# Altium footprint library Sockets.PcbLib: 80 footprints (part 4 of 6) (continued)
## IDI_220393-000_a [mm] "196 Pins, Pitch 0.8mm, Matrix 14x14, BGA Test Socket (Contactor Part)"
height 6.41
pads (8):
  round 0.5 hole 1.55 unplated: 1(-14.25,14.25) 2(-14.25,-14.25) 3(14.25,-14.25) 4(14.25,14.25)
  round 0.5 hole 2.4 unplated: 5(-16.75,16.75) 6(-16.75,-16.75) 7(16.75,-16.75) 8(16.75,16.75)
Top Layer:
  circle w0.915: c-16.75,16.75 r1.793
  circle w0.915: c-16.75,-16.75 r1.793
  circle w0.915: c16.75,-16.75 r1.793
  circle w0.915: c16.75,16.75 r1.793
Bottom Layer:
  circle w0.915: c-16.75,16.75 r1.793
  circle w0.915: c-16.75,-16.75 r1.793
  circle w0.915: c16.75,-16.75 r1.793
  circle w0.915: c16.75,16.75 r1.793
Top Overlay:
  lines w0.2: -20.05,-17.75 ccw(c-17.75,-17.75) -17.75,-20.05 17.75,-20.05 ccw(c17.75,-17.75) 20.05,-17.75 20.05,17.75 ccw(c17.75,17.75) 17.75,20.05 -17.75,20.05 ccw(c-17.75,17.75) -20.05,17.75 -20.05,-17.75
  text "A1" at -22.437,17.235 h1.2
Top Solder:
  drawing of 69 lines, arcs and shapes, not listed
Mechanical 8:
  drawing of 518 lines, arcs and shapes, not listed
  text "COMPONENT" at 4.13,15.435 h1
  text "CLEARANCE HEIGHT 2mm" at 8.85,17.725 h1
  text "CLEARANCE HEIGHT 1mm" at 8.59,12.5 h1
  text "COMPONENT" at 15.435,-4.13 h1
  text "CLEARANCE HEIGHT 2mm" at 17.725,-8.85 h1
  text "CLEARANCE HEIGHT 1mm" at 12.5,-8.59 h1
  text "COMPONENT" at -4.13,-15.435 h1
  text "CLEARANCE HEIGHT 2mm" at -8.85,-17.725 h1
  text "CLEARANCE HEIGHT 1mm" at -8.59,-12.5 h1
  text "CLEARANCE HEIGHT 1mm" at -12.5,8.59 h1
  text "CLEARANCE HEIGHT 2mm" at -17.725,8.85 h1
  text "COMPONENT" at -15.435,4.13 h1
Mechanical 14:
  drawing of 216 lines, arcs and shapes, not listed
  text "A1" at -22.437,17.235 h1.2
  text "A1" at -7.75,9.596 h1.2
  text "A1" at -11.238,13.15 h1.2
Mechanical 15:
  lines w0.05: -20.3,-17.75 ccw(c-17.75,-17.75) -17.75,-20.3 17.75,-20.3 ccw(c17.75,-17.75) 20.3,-17.75 20.3,17.75 ccw(c17.75,17.75) 17.75,20.3 -17.75,20.3 ccw(c-17.75,17.75) -20.3,17.75 -20.3,-17.75
3D body "IDI_220393-000_Part2.stp": height -1.6, standoff -4.3, extent -19.25,-19.245 19.23,19.245
3D body "IDI_220393-000_Part1.stp": height 6.43, standoff -5.77, extent -19.75,-19.75 19.75,19.75

## IDI_220394-000 [mm] "Removable Clamshell for 196 Pins, Pitch 0.8mm, Matrix 14x14, BGA Test Socket"
height 36.5
Top Overlay:
  lines w0.2: -50.3,-1.624 -49.624,-2.3 -20.05,-2.3 -20.05,-16.97 ccw(c-17.75,-16.97) -19.376,-18.596 -16.546,-21.426 ccw(c-14.92,-19.8) -14.92,-22.1 -8.38,-22.1 -8.38,-22.6 8.37,-22.6 8.37,-22.1 14.92,-22.1 ccw(c14.92,-19.8) 16.546,-21.427 19.376,-18.598 ccw(c17.75,-16.972) 20.05,-16.972 20.05,16.172 ccw(c17.75,16.172) 19.376,17.798 16.548,20.626 ccw(c14.922,19) 14.922,21.3 -14.922,21.3 ccw(c-14.922,19) -16.548,20.626 -19.377,17.796 ccw(c-17.75,16.17) -20.05,16.17 -20.05,2.3 -49.624,2.3 -50.3,1.624 -50.3,-1.624
Mechanical 8:
  lines w0.1: -0.5,0 0,0 ; 0,-0.5 0,0 ; 0,0.5 0,0 ; 0.5,0 0,0
Mechanical 14:
  circle w0.1: c0,0 r4.5
  circle w0.1: c0,0 r2.5
  circle w0.1: c-15,0 r1.025
  circle w0.1: c-7.95,7.95 r1.9
  circle w0.1: c-7.95,-7.95 r1.9
  circle w0.1: c7.95,-7.95 r1.9
  circle w0.1: c7.95,7.95 r1.9
  circle w0.1: c-15,0 r1.25
  circle w0.1: c12,12 r0.8
  circle w0.1: c0,16.97 r0.8
  circle w0.1: c-12,12 r0.8
  circle w0.1: c-12,-12 r0.8
  circle w0.1: c0,-16.97 r0.8
  circle w0.1: c12,-12 r0.8
  circle w0.1: c16.97,0 r0.8
  circle w0.1: c0,0 r19.5
  circle w0.1: c0,0 r9
  lines w0.1: -19.42,-1.8 ccw(c-18.427,-1.704) -19.17,-2.37 cw(c-23.555,-6.31) -17.79,-7.54 ccw(c-16.821,-7.723) -17.71,-8.15 ; -19.42,1.8 cw(c-18.427,1.704) -19.17,2.37 ccw(c-23.555,6.31) -17.79,7.54 cw(c-16.821,7.723) -17.71,8.15 ; -19.38,-2 -49.5,-2 ; -19.38,2 -49.5,2 ; -19.16,-18.39 -16.34,-21.21 ; -19.16,17.59 -16.34,20.41 ; -18.5,-6.16 -18.5,-12.67 ccw(c-16.5,-12.67) -17.914,-14.084 ; -18.5,6.16 -18.5,12.67 cw(c-16.5,12.67) -17.914,14.084 ; -17.91,-14.09 -15.09,-16.91 ; -17.91,14.09 -15.09,16.91 ; -16.334,20.414 cw(c-14.92,19) -14.92,21 14.92,21 cw(c14.92,19) 16.334,20.414 ; -15.92,-11.26 ccw(c-15.107,-10.684) -15.42,-11.63 cw(c-17.246,-17.246) -11.63,-15.42 ccw(c-10.684,-15.107) -11.26,-15.92 ; -15.92,11.26 cw(c-15.107,10.684) -15.42,11.63 ccw(c-17.246,17.246) -11.63,15.42 cw(c-10.684,15.107) -11.26,15.92 ; -15.084,-16.914 ccw(c-13.67,-15.5) -13.67,-17.5 -8.6,-17.5 ; -15.084,16.914 cw(c-13.67,15.5) -13.67,17.5 -8.6,17.5 ; -10.031,-7.398 cw(c0,0) -10.031,7.398 ; -9.48,-6.43 -7.7,-4.66 ; -9.48,6.43 -7.7,4.66 ; -9.47,-6.43 ccw(c-7.95,-7.95) -6.43,-9.47 ; -9.47,6.43 cw(c-7.95,7.95) -6.43,9.47 ; -8.855,-1.631 cw(c-7.04,0) -8.855,1.631 ; -8.15,-17.71 ccw(c-7.723,-16.821) -7.54,-17.79 cw(c-6.31,-23.555) -2.37,-19.17 ccw(c-1.704,-18.427) -1.8,-19.42 ; -8.15,17.71 cw(c-7.723,16.821) -7.54,17.79 ccw(c-6.31,23.555) -2.37,19.17 cw(c-1.704,18.427) -1.8,19.42 ; -8.08,-17.75 -8.08,-21.8 ; -8,-19.8 8,-19.8 ; -8,-19.1 -3.93,-19.1 ; -8,-17.78 -8,-22.3 8,-22.3 8,-17.78 ; -7.398,-10.031 ccw(c0,0) 7.398,-10.031 ; -7.398,10.031 cw(c0,0) 7.398,10.031 ; -6.43,-9.48 -4.66,-7.7 ; -6.43,9.48 -4.66,7.7 ; -3,-19.8 -3,-19.27 ; 1.8,-19.42 ccw(c1.704,-18.427) 2.37,-19.17 cw(c6.31,-23.555) 7.54,-17.79 ccw(c7.723,-16.821) 8.15,-17.71 ; 1.8,19.42 cw(c1.704,18.427) 2.37,19.17 ccw(c6.31,23.555) 7.54,17.79 cw(c7.723,16.821) 8.15,17.71 ; 3,-19.8 3,-19.27 ; 3.93,-19.1 8,-19.1 ; 4.66,-7.7 6.43,-9.48 ; 4.66,7.7 6.43,9.48 ; 6.43,-9.47 ccw(c7.95,-7.95) 9.47,-6.43 ; 6.43,9.47 cw(c7.95,7.95) 9.47,6.43 ; 7.7,-4.66 9.48,-6.43 ; 7.7,4.66 9.48,6.43 ; 8.07,-17.75 8.07,-21.8 ; 8.6,-17.5 13.67,-17.5 ccw(c13.67,-15.5) 15.084,-16.914 ; 8.6,17.5 13.67,17.5 cw(c13.67,15.5) 15.084,16.914 ; 10.031,-7.398 ccw(c0,0) 10.031,7.398 ; 11.26,-15.92 ccw(c10.684,-15.107) 11.63,-15.42 cw(c17.245,-17.246) 15.42,-11.63 ccw(c15.107,-10.684) 15.92,-11.26 ; 11.26,15.92 cw(c10.684,15.107) 11.63,15.42 ccw(c17.245,17.246) 15.42,11.63 cw(c15.107,10.684) 15.92,11.26 ; 15.09,-16.91 17.91,-14.09 ; 15.09,16.91 17.91,14.09 ; 16.334,-21.214 cw(c14.92,-19.8) 14.92,-21.8 ; 16.34,-21.21 19.16,-18.39 ; 16.34,20.41 19.16,17.59 ; 17.71,-8.15 ccw(c16.821,-7.723) 17.79,-7.54 cw(c23.555,-6.31) 19.17,-2.37 ccw(c18.427,-1.704) 19.42,-1.8 ; 17.71,8.15 cw(c16.821,7.723) 17.79,7.54 ccw(c23.555,6.31) 19.17,2.37 cw(c18.427,1.704) 19.42,1.8 ; 17.914,-14.084 ccw(c16.5,-12.67) 18.5,-12.67 18.5,-6.16 ; 17.914,14.084 cw(c16.5,12.67) 18.5,12.67 18.5,6.16 ; 19.164,-18.384 ccw(c17.75,-16.97) 19.75,-16.97 19.75,16.17 ccw(c17.75,16.17) 19.164,17.584 ; -50,-1.5 -50,1.5 ; -50,-1.5 -49.5,-2 ; -50,-1.5 -49.5,-2 ; -50,-1.5 -50,1.5 ; -50,1.5 -49.5,2 ; -50,1.5 -49.5,2 ; -49.5,-2 -49.5,2 ; -49.5,-2 -19.75,-2 ; -49.5,2 -19.75,2 ; -19.75,-16.97 ccw(c-17.75,-16.97) -19.164,-18.384 ; -19.75,-16.97 ccw(c-17.75,-16.97) -19.164,-18.384 ; -19.75,-16.97 -19.75,-2 ; -19.75,-16.97 -19.75,-2 ; -19.75,2 -19.75,16.17 ; -19.75,2 -19.75,16.17 ; -19.75,16.17 cw(c-17.75,16.17) -19.164,17.584 ; -19.75,16.17 cw(c-17.75,16.17) -19.165,17.584 ; -19.164,-18.384 -16.334,-21.214 ; -19.165,17.584 -16.336,20.414 cw(c-14.922,19) -14.922,21 14.922,21 cw(c14.922,19) 16.336,20.414 19.164,17.586 cw(c17.75,16.172) 19.75,16.172 19.75,-16.972 cw(c17.75,-16.972) 19.164,-18.386 16.334,-21.215 cw(c14.92,-19.8) 14.92,-21.8 ; -16.334,-21.214 ccw(c-14.92,-19.8) -14.92,-21.8 ; -16.334,-21.214 ccw(c-14.92,-19.8) -14.92,-21.8 ; -14.92,-21.8 -8.08,-21.8 ; -14.92,-21.8 -8.08,-21.8 ; -8.08,-21.8 -8.08,-22.3 8.07,-22.3 8.07,-21.8 ; 8.07,-21.8 14.92,-21.8 ; 8.07,-21.8 14.92,-21.8
Mechanical 15:
  lines w0.05: -50.55,-1.728 -49.728,-2.55 -20.3,-2.55 -20.3,-16.97 ccw(c-17.75,-16.97) -19.553,-18.773 -16.723,-21.603 ccw(c-14.92,-19.8) -14.92,-22.35 -8.63,-22.35 -8.63,-22.85 8.62,-22.85 8.62,-22.35 14.92,-22.35 ccw(c14.92,-19.8) 16.723,-21.604 19.553,-18.775 ccw(c17.75,-16.972) 20.3,-16.972 20.3,16.172 ccw(c17.75,16.172) 19.553,17.975 16.725,20.803 ccw(c14.922,19) 14.922,21.55 -14.922,21.55 ccw(c-14.922,19) -16.725,20.803 -19.554,17.973 ccw(c-17.75,16.17) -20.3,16.17 -20.3,2.55 -49.728,2.55 -50.55,1.728 -50.55,-1.728
3D body "IDI_220394-000.stp": height 44.75, standoff 4.45, extent -50,-22.3 19.75,21

## MIL-MAX_917-93-103-41-005000 [mm] "3 Leads Through-Hole TO-5 Socket"
height 4.2
pads (3):
  round 1.5 hole 0.8: 1(0,2.54) 2(-2.54,0) 3(0,-2.54)
Top Overlay:
  lines w0.2: 2.533,4.315 ccw(c0,0) 4.315,2.533 ccw(c3.538,3.538) 2.533,4.315
Mechanical 8:
  lines w0.1: -3.04,0 -2.54,0 ; -2.54,-0.5 -2.54,0 ; -2.54,0.5 -2.54,0 ; -2.04,0 -2.54,0 ; -0.5,-2.54 0,-2.54 ; -0.5,0 0,0 ; -0.5,2.54 0,2.54 ; 0,-3.04 0,-2.54 ; 0,-2.04 0,-2.54 ; 0,-0.5 0,0 ; 0,0.5 0,0 ; 0,2.04 0,2.54 ; 0,3.04 0,2.54 ; 0.5,-2.54 0,-2.54 ; 0.5,0 0,0 ; 0.5,2.54 0,2.54
Mechanical 14:
  circle w0.1: c0,2.54 r0.546
  circle w0.1: c-2.54,0 r0.546
  circle w0.1: c0,-2.54 r0.546
  lines w0.1: 2.533,4.315 ccw(c0,0) 4.315,2.533 ccw(c3.538,3.538) 2.533,4.315
3D body "MIL-MAX_917-93-103-41-005000.stp": height 4.19, standoff -3.18, extent -4.982,-4.982 5.002,5.002

## MIL-MAX_917-93-103-41-005000_a [mm] "3 Leads Through-Hole TO-5 Socket"
height 4.2
Top Overlay:
  lines w0.2: 2.533,4.315 ccw(c0,0) 4.315,2.533 ccw(c3.538,3.538) 2.533,4.315
Mechanical 8:
  lines w0.1: -3.04,0 -2.54,0 ; -2.54,-0.5 -2.54,0 ; -2.54,0.5 -2.54,0 ; -2.04,0 -2.54,0 ; -0.5,-2.54 0,-2.54 ; -0.5,0 0,0 ; -0.5,2.54 0,2.54 ; 0,-3.04 0,-2.54 ; 0,-2.04 0,-2.54 ; 0,-0.5 0,0 ; 0,0.5 0,0 ; 0,2.04 0,2.54 ; 0,3.04 0,2.54 ; 0.5,-2.54 0,-2.54 ; 0.5,0 0,0 ; 0.5,2.54 0,2.54
Mechanical 14:
  circle w0.1: c0,2.54 r0.546
  circle w0.1: c-2.54,0 r0.546
  circle w0.1: c0,-2.54 r0.546
  lines w0.1: 2.533,4.315 ccw(c0,0) 4.315,2.533 ccw(c3.538,3.538) 2.533,4.315
3D body "MIL-MAX_917-93-103-41-005000.stp": height 4.19, standoff -3.18, extent -4.982,-4.982 5.002,5.002

## MIL-MAX_917-93-104-41-005000 [mm] "4 Leads Through-Hole TO-5 Socket"
height 4.2
pads (4):
  round 1.5 hole 0.8: 1(0,2.54) 2(-2.54,0) 3(0,-2.54) 4(2.54,0)
Top Overlay:
  lines w0.2: 2.533,4.315 cw(c3.538,3.538) 4.315,2.533 cw(c0,0) 2.533,4.315
Mechanical 8:
  lines w0.1: -3.04,0 -2.54,0 ; -2.54,-0.5 -2.54,0 ; -2.54,0.5 -2.54,0 ; -2.04,0 -2.54,0 ; -0.5,-2.54 0,-2.54 ; -0.5,0 0,0 ; -0.5,2.54 0,2.54 ; 0,-3.04 0,-2.54 ; 0,-2.04 0,-2.54 ; 0,-0.5 0,0 ; 0,0.5 0,0 ; 0,2.04 0,2.54 ; 0,3.04 0,2.54 ; 0.5,-2.54 0,-2.54 ; 0.5,0 0,0 ; 0.5,2.54 0,2.54 ; 2.04,0 2.54,0 ; 2.54,-0.5 2.54,0 ; 2.54,0.5 2.54,0 ; 3.04,0 2.54,0
Mechanical 14:
  circle w0.1: c2.54,0 r0.546
  circle w0.1: c0,-2.54 r0.546
  circle w0.1: c-2.54,0 r0.546
  circle w0.1: c0,2.54 r0.546
  lines w0.1: 2.533,4.315 cw(c3.538,3.538) 4.315,2.533 cw(c0,0) 2.533,4.315
3D body "MIL-MAX_917-93-104-41-005000.stp": height 4.19, standoff -3.18, extent -4.982,-4.982 5.002,5.002

## MIL-MAX_917-93-104-41-005000_a [mm] "4 Leads Through-Hole TO-5 Socket"
height 4.2
Top Overlay:
  lines w0.2: 2.533,4.315 ccw(c0,0) 4.315,2.533 ccw(c3.538,3.538) 2.533,4.315
Mechanical 8:
  lines w0.1: -3.04,0 -2.54,0 ; -2.54,-0.5 -2.54,0 ; -2.54,0.5 -2.54,0 ; -2.04,0 -2.54,0 ; -0.5,-2.54 0,-2.54 ; -0.5,0 0,0 ; -0.5,2.54 0,2.54 ; 0,-3.04 0,-2.54 ; 0,-2.04 0,-2.54 ; 0,-0.5 0,0 ; 0,0.5 0,0 ; 0,2.04 0,2.54 ; 0,3.04 0,2.54 ; 0.5,-2.54 0,-2.54 ; 0.5,0 0,0 ; 0.5,2.54 0,2.54 ; 2.04,0 2.54,0 ; 2.54,-0.5 2.54,0 ; 2.54,0.5 2.54,0 ; 3.04,0 2.54,0
Mechanical 14:
  circle w0.1: c0,2.54 r0.546
  circle w0.1: c-2.54,0 r0.546
  circle w0.1: c0,-2.54 r0.546
  circle w0.1: c2.54,0 r0.546
  lines w0.1: 2.533,4.315 ccw(c0,0) 4.315,2.533 ccw(c3.538,3.538) 2.533,4.315
3D body "MIL-MAX_917-93-104-41-005000.stp": height 4.19, standoff -3.18, extent -4.982,-4.982 5.002,5.002

## MOLEX_87782-3003 [mm] "244 Positions, 0.6mm Pitch, miniDIMM DDR3 Vertical Socket"
height 17
pads (250):
  rect 0.35x1.75 smd: 1(-37.8,-1.38) 2(-37.2,-1.38) 3(-36.6,-1.38) 4(-36,-1.38) 5(-35.4,-1.38) 6(-34.8,-1.38) 7(-34.2,-1.38) 8(-33.6,-1.38) 9(-33,-1.38) 10(-32.4,-1.38) 11(-31.8,-1.38) 12(-31.2,-1.38) 13(-30.6,-1.38) 14(-30,-1.38) 15(-29.4,-1.38) 16(-28.8,-1.38) 17(-28.2,-1.38) 18(-27.6,-1.38) 19(-27,-1.38) 20(-26.4,-1.38) 21(-25.8,-1.38) 22(-25.2,-1.38) 23(-24.6,-1.38) 24(-24,-1.38) 25(-23.4,-1.38) 26(-22.8,-1.38) 27(-22.2,-1.38) 28(-21.6,-1.38) 29(-21,-1.38) 30(-20.4,-1.38) 31(-19.8,-1.38) 32(-19.2,-1.38) 33(-18.6,-1.38) 34(-18,-1.38) 35(-17.4,-1.38) 36(-16.8,-1.38) 37(-16.2,-1.38) 38(-15.6,-1.38) 39(-15,-1.38) 40(-14.4,-1.38) 41(-13.8,-1.38) 42(-13.2,-1.38) 43(-12.6,-1.38) 44(-12,-1.38) 45(-11.4,-1.38) 46(-10.8,-1.38) 47(-10.2,-1.38) 48(-9.6,-1.38) 49(-9,-1.38) 50(-8.4,-1.38) 51(-7.8,-1.38) 52(-7.2,-1.38) 53(-6.6,-1.38) 54(-6,-1.38) 55(-5.4,-1.38) 56(-4.8,-1.38) 57(-4.2,-1.38) 58(-3.6,-1.38) 59(-3,-1.38) 60(-2.4,-1.38) 61(-1.8,-1.38) 62(-1.2,-1.38) 63(-0.6,-1.38) 64(0,-1.38) 65(0.6,-1.38) 66(4.2,-1.38) 67(4.8,-1.38) 68(5.4,-1.38) 69(6,-1.38) 70(6.6,-1.38) 71(7.2,-1.38) 72(7.8,-1.38) 73(8.4,-1.38) 74(9,-1.38) 75(9.6,-1.38) 76(10.2,-1.38) 77(10.8,-1.38) 78(11.4,-1.38) 79(12,-1.38) 80(12.6,-1.38) 81(13.2,-1.38) 82(13.8,-1.38) 83(14.4,-1.38) 84(15,-1.38) 85(15.6,-1.38) 86(16.2,-1.38) 87(16.8,-1.38) 88(17.4,-1.38) 89(18,-1.38) 90(18.6,-1.38) 91(19.2,-1.38) 92(19.8,-1.38) 93(20.4,-1.38) 94(21,-1.38) 95(21.6,-1.38) 96(22.2,-1.38) 97(22.8,-1.38) 98(23.4,-1.38) 99(24,-1.38) 100(24.6,-1.38) 101(25.2,-1.38) 102(25.8,-1.38) 103(26.4,-1.38) 104(27,-1.38) 105(27.6,-1.38) 106(28.2,-1.38) 107(28.8,-1.38) 108(29.4,-1.38) 109(30,-1.38) 110(30.6,-1.38) 111(31.2,-1.38) 112(31.8,-1.38) 113(32.4,-1.38) 114(33,-1.38) 115(33.6,-1.38) 116(34.2,-1.38) 117(34.8,-1.38) 118(35.4,-1.38) 119(36,-1.38) 120(36.6,-1.38) 121(37.2,-1.38) 122(37.8,-1.38) 123(-37.8,1.38) 124(-37.2,1.38) 125(-36.6,1.38) 126(-36,1.38) 127(-35.4,1.38) 128(-34.8,1.38) 129(-34.2,1.38) 130(-33.6,1.38) 131(-33,1.38) 132(-32.4,1.38) 133(-31.8,1.38) 134(-31.2,1.38) 135(-30.6,1.38) 136(-30,1.38) 137(-29.4,1.38) 138(-28.8,1.38) 139(-28.2,1.38) 140(-27.6,1.38) 141(-27,1.38) 142(-26.4,1.38) 143(-25.8,1.38) 144(-25.2,1.38) 145(-24.6,1.38) 146(-24,1.38) 147(-23.4,1.38) 148(-22.8,1.38) 149(-22.2,1.38) 150(-21.6,1.38) 151(-21,1.38) 152(-20.4,1.38) 153(-19.8,1.38) 154(-19.2,1.38) 155(-18.6,1.38) 156(-18,1.38) 157(-17.4,1.38) 158(-16.8,1.38) 159(-16.2,1.38) 160(-15.6,1.38) 161(-15,1.38) 162(-14.4,1.38) 163(-13.8,1.38) 164(-13.2,1.38) 165(-12.6,1.38) 166(-12,1.38) 167(-11.4,1.38) 168(-10.8,1.38) 169(-10.2,1.38) 170(-9.6,1.38) 171(-9,1.38) 172(-8.4,1.38) 173(-7.8,1.38) 174(-7.2,1.38) 175(-6.6,1.38) 176(-6,1.38) 177(-5.4,1.38) 178(-4.8,1.38) 179(-4.2,1.38) 180(-3.6,1.38) 181(-3,1.38) 182(-2.4,1.38) 183(-1.8,1.38) 184(-1.2,1.38) 185(-0.6,1.38) 186(0,1.38) 187(0.6,1.38) 188(4.2,1.38) 189(4.8,1.38) 190(5.4,1.38) 191(6,1.38) 192(6.6,1.38) 193(7.2,1.38) 194(7.8,1.38) 195(8.4,1.38) 196(9,1.38) 197(9.6,1.38) 198(10.2,1.38) 199(10.8,1.38) 200(11.4,1.38) 201(12,1.38) 202(12.6,1.38) 203(13.2,1.38) 204(13.8,1.38) 205(14.4,1.38) 206(15,1.38) 207(15.6,1.38) 208(16.2,1.38) 209(16.8,1.38) 210(17.4,1.38) 211(18,1.38) 212(18.6,1.38) 213(19.2,1.38) 214(19.8,1.38) 215(20.4,1.38) 216(21,1.38) 217(21.6,1.38) 218(22.2,1.38) 219(22.8,1.38) 220(23.4,1.38) 221(24,1.38) 222(24.6,1.38) 223(25.2,1.38) 224(25.8,1.38) 225(26.4,1.38) 226(27,1.38) 227(27.6,1.38) 228(28.2,1.38) 229(28.8,1.38) 230(29.4,1.38) 231(30,1.38) 232(30.6,1.38) 233(31.2,1.38) 234(31.8,1.38) 235(32.4,1.38) 236(33,1.38) 237(33.6,1.38) 238(34.2,1.38) 239(34.8,1.38) 240(35.4,1.38) 241(36,1.38) 242(36.6,1.38) 243(37.2,1.38) 244(37.8,1.38)
  rect 6.5x6 smd: 245(-45.2,0) 246(45.15,0)
  rect 2.8x2.77 smd: MECH(2.4,-3.08) MECH(2.4,3.08)
  round 0.5 hole 1.5 unplated: MECH(2.4,0)
  round 0.5 hole 1.4 unplated: MECH(39,0)
Top Overlay:
  drawing of 173 lines, arcs and shapes, not listed
Mechanical 8:
  circle w0.1: c39,0 r0.7
  circle w0.1: c2.4,0 r0.75
  lines w0.1: -45.7,0 -45.2,0 ; -45.2,-0.5 -45.2,0 ; -45.2,0.5 -45.2,0 ; -44.7,0 -45.2,0 ; -0.354,-0.354 0,0 ; -0.354,0.354 0,0 ; 0.354,-0.354 0,0 ; 0.354,0.354 0,0 ; 1.9,-3.08 2.4,-3.08 ; 1.9,0 2.4,0 ; 1.9,3.08 2.4,3.08 ; 2.4,-3.58 2.4,-3.08 ; 2.4,-2.58 2.4,-3.08 ; 2.4,-0.5 2.4,0 ; 2.4,0.5 2.4,0 ; 2.4,2.58 2.4,3.08 ; 2.4,3.58 2.4,3.08 ; 2.9,-3.08 2.4,-3.08 ; 2.9,0 2.4,0 ; 2.9,3.08 2.4,3.08 ; 38.5,0 39,0 ; 39,-0.5 39,0 ; 39,0.5 39,0 ; 39.5,0 39,0 ; 44.65,0 45.15,0 ; 45.15,-0.5 45.15,0 ; 45.15,0.5 45.15,0 ; 45.65,0 45.15,0 ; -37.975,-2.255 -37.8,-1.38 -37.625,-2.255 ; -37.975,-2.255 -37.975,-0.505 -37.625,-0.505 -37.625,-2.255 ; -37.975,-2.255 -37.625,-2.255 ; -37.975,2.255 -37.8,1.38 -37.625,2.255 ; -37.975,2.255 -37.975,0.505 -37.625,0.505 -37.625,2.255 ; -37.975,2.255 -37.625,2.255 ; 0.425,-2.255 0.6,-1.38 0.775,-2.255 ; 0.425,-2.255 0.425,-0.505 0.775,-0.505 0.775,-2.255 ; 0.425,-2.255 0.775,-2.255 ; 0.425,2.255 0.6,1.38 0.775,2.255 ; 0.425,2.255 0.425,0.505 0.775,0.505 0.775,2.255 ; 0.425,2.255 0.775,2.255 ; 4.025,-2.255 4.2,-1.38 4.375,-2.255 ; 4.025,-2.255 4.025,-0.505 4.375,-0.505 4.375,-2.255 ; 4.025,-2.255 4.375,-2.255 ; 4.025,2.255 4.2,1.38 4.375,2.255 ; 4.025,2.255 4.025,0.505 4.375,0.505 4.375,2.255 ; 4.025,2.255 4.375,2.255 ; 37.625,-2.255 37.8,-1.38 37.975,-2.255 ; 37.625,-2.255 37.625,-0.505 37.975,-0.505 37.975,-2.255 ; 37.625,-2.255 37.975,-2.255 ; 37.625,2.255 37.8,1.38 37.975,2.255 ; 37.625,2.255 37.625,0.505 37.975,0.505 37.975,2.255 ; 37.625,2.255 37.975,2.255 ; -48.45,-3 -48.45,3 -41.95,3 -41.95,-3 -48.45,-3 ; -9.525,0 -8.853,-3.81 8.853,-3.81 9.525,0 8.853,3.81 -8.853,3.81 -9.525,0 ; 1,-4.465 1,-1.695 3.8,-1.695 3.8,-4.465 1,-4.465 ; 1,1.695 1,4.465 3.8,4.465 3.8,1.695 1,1.695 ; 41.9,-3 41.9,3 48.4,3 48.4,-3 41.9,-3
Mechanical 14:
  drawing of 875 lines, arcs and shapes, not listed
Mechanical 15:
  lines w0.05: -48.7,-4.2 -48.7,4.2 0.75,4.2 0.75,4.715 4.05,4.715 4.05,4.2 48.65,4.2 48.65,-4.2 4.05,-4.2 4.05,-4.715 0.75,-4.715 0.75,-4.2 -48.7,-4.2
3D body "MOLEX_87782-3003.stp": height 16.4, standoff -1.55, extent -48,-3.95 48,3.95

## MOLEX_87918-0001 [mm] "0.60mm Pitch miniDIMM DDR2 Socket, Surface Mount, Right Angle, 1.8V Key, 244 Circuits"
height 9.79
pads (253):
  rect 0.35x2 smd: 1(-40.2,-3.35) 2(-39.6,-3.35) 3(-39,-3.35) 4(-38.4,-3.35) 5(-37.8,-3.35) 6(-37.2,-3.35) 7(-36.6,-3.35) 8(-36,-3.35) 9(-35.4,-3.35) 10(-34.8,-3.35) 11(-34.2,-3.35) 12(-33.6,-3.35) 13(-33,-3.35) 14(-32.4,-3.35) 15(-31.8,-3.35) 16(-31.2,-3.35) 17(-30.6,-3.35) 18(-30,-3.35) 19(-29.4,-3.35) 20(-28.8,-3.35) 21(-28.2,-3.35) 22(-27.6,-3.35) 23(-27,-3.35) 24(-26.4,-3.35) 25(-25.8,-3.35) 26(-25.2,-3.35) 27(-24.6,-3.35) 28(-24,-3.35) 29(-23.4,-3.35) 30(-22.8,-3.35) 31(-22.2,-3.35) 32(-21.6,-3.35) 33(-21,-3.35) 34(-20.4,-3.35) 35(-19.8,-3.35) 36(-19.2,-3.35) 37(-18.6,-3.35) 38(-18,-3.35) 39(-17.4,-3.35) 40(-16.8,-3.35) 41(-16.2,-3.35) 42(-15.6,-3.35) 43(-15,-3.35) 44(-14.4,-3.35) 45(-13.8,-3.35) 46(-13.2,-3.35) 47(-12.6,-3.35) 48(-12,-3.35) 49(-11.4,-3.35) 50(-10.8,-3.35) 51(-10.2,-3.35) 52(-9.6,-3.35) 53(-9,-3.35) 54(-8.4,-3.35) 55(-7.8,-3.35) 56(-7.2,-3.35) 57(-6.6,-3.35) 58(-6,-3.35) 59(-5.4,-3.35) 60(-4.8,-3.35) 61(-4.2,-3.35) 62(-3.6,-3.35) 63(-3,-3.35) 64(-2.425,-3.35) 65(-1.8,-3.35) 66(1.8,-3.35) 67(2.4,-3.35) 68(3,-3.35) 69(3.6,-3.35) 70(4.2,-3.35) 71(4.8,-3.35) 72(5.4,-3.35) 73(6,-3.35) 74(6.6,-3.35) 75(7.2,-3.35) 76(7.8,-3.35) 77(8.4,-3.35) 78(9,-3.35) 79(9.6,-3.35) 80(10.2,-3.35) 81(10.8,-3.35) 82(11.4,-3.35) 83(12,-3.35) 84(12.6,-3.35) 85(13.2,-3.35) 86(13.8,-3.35) 87(14.4,-3.35) 88(15,-3.35) 89(15.6,-3.35) 90(16.2,-3.35) 91(16.8,-3.35) 92(17.4,-3.35) 93(18,-3.35) 94(18.6,-3.35) 95(19.2,-3.35) 96(19.8,-3.35) 97(20.4,-3.35) 98(21,-3.35) 99(21.6,-3.35) 100(22.2,-3.35) 101(22.8,-3.35) 102(23.4,-3.35) 103(24,-3.35) 104(24.6,-3.35) 105(25.2,-3.35) 106(25.8,-3.35) 107(26.4,-3.35) 108(27,-3.35) 109(27.6,-3.35) 110(28.2,-3.35) 111(28.8,-3.35) 112(29.4,-3.35) 113(30,-3.35) 114(30.6,-3.35) 115(31.2,-3.35) 116(31.8,-3.35) 117(32.4,-3.35) 118(33,-3.35) 119(33.6,-3.35) 120(34.2,-3.35) 121(34.8,-3.35) 122(35.4,-3.35) 123(-40.2,5.35) 124(-39.6,5.35) 125(-39,5.35) 126(-38.4,5.35) 127(-37.8,5.35) 128(-37.2,5.35) 129(-36.6,5.35) 130(-36,5.35) 131(-35.4,5.35) 132(-34.8,5.35) 133(-34.2,5.35) 134(-33.6,5.35) 135(-33,5.35) 136(-32.4,5.35) 137(-31.8,5.35) 138(-31.2,5.35) 139(-30.6,5.35) 140(-30,5.35) 141(-29.4,5.35) 142(-28.8,5.35) 143(-28.2,5.35) 144(-27.6,5.35) 145(-27,5.35) 146(-26.4,5.35) 147(-25.8,5.35) 148(-25.2,5.35) 149(-24.6,5.35) 150(-24,5.35) 151(-23.4,5.35) 152(-22.8,5.35) 153(-22.2,5.35) 154(-21.6,5.35) 155(-21,5.35) 156(-20.4,5.35) 157(-19.8,5.35) 158(-19.2,5.35) 159(-18.6,5.35) 160(-18,5.35) 161(-17.4,5.35) 162(-16.8,5.35) 163(-16.2,5.35) 164(-15.6,5.35) 165(-15,5.35) 166(-14.4,5.35) 167(-13.8,5.35) 168(-13.2,5.35) 169(-12.6,5.35) 170(-12,5.35) 171(-11.4,5.35) 172(-10.8,5.35) 173(-10.2,5.35) 174(-9.6,5.35) 175(-9,5.35) 176(-8.4,5.35) 177(-7.8,5.35) 178(-7.2,5.35) 179(-6.6,5.35) 180(-6,5.35) 181(-5.4,5.35) 182(-4.8,5.35) 183(-4.2,5.35) 184(-3.6,5.35) 185(-3,5.35) 186(-2.4,5.35) 187(-1.8,5.35) 188(1.8,5.35) 189(2.4,5.35) 190(3,5.35) 191(3.6,5.35) 192(4.2,5.35) 193(4.8,5.35) 194(5.4,5.35) 195(6,5.35) 196(6.6,5.35) 197(7.2,5.35) 198(7.8,5.35) 199(8.4,5.35) 200(9,5.35) 201(9.6,5.35) 202(10.2,5.35) 203(10.8,5.35) 204(11.4,5.35) 205(12,5.35) 206(12.6,5.35) 207(13.2,5.35) 208(13.8,5.35) 209(14.4,5.35) 210(15,5.35) 211(15.6,5.35) 212(16.2,5.35) 213(16.8,5.35) 214(17.4,5.35) 215(18,5.35) 216(18.6,5.35) 217(19.2,5.35) 218(19.8,5.35) 219(20.4,5.35) 220(21,5.35) 221(21.6,5.35) 222(22.2,5.35) 223(22.8,5.35) 224(23.4,5.35) 225(24,5.35) 226(24.6,5.35) 227(25.2,5.35) 228(25.8,5.35) 229(26.4,5.35) 230(27,5.35) 231(27.6,5.35) 232(28.2,5.35) 233(28.8,5.35) 234(29.4,5.35) 235(30,5.35) 236(30.6,5.35) 237(31.2,5.35) 238(31.8,5.35) 239(32.4,5.35) 240(33,5.35) 241(33.6,5.35) 242(34.2,5.35) 243(34.8,5.35) 244(35.4,5.35)
  round 0.5 hole 2.5 unplated: M1(-45.5,0) M2(0,0) M3(40.7,0)
  rect 4.8x5 smd: P1(-45.5,4.59) P2(-45.5,-4.59) P3(40.7,4.59) P4(40.7,-4.59)
  rect 2.6x5 smd: P5(0,4.59) P6(0,-4.59)
Top Overlay:
  circle w0.25: c-40.2,-4.9 r0.125
  lines w0.2: -52.738,6.043 -50.279,7.64 ; -50.4,8.75 -44.7,8.75 ; -50.4,10.9 -51.606,10.117 -51.77,10.369 -52.562,10.258 -52.611,10.604 -53.403,10.493 -53.452,10.839 -54.244,10.728 -54.293,11.075 -55.085,10.963 ccw(c-55.016,10.468) -55.435,10.196 -52.197,5.211 cw(c-52.706,2.134) -51.111,4.814 cw(c-52.653,2.241) -50.137,3.874 -49.63,3.093 ccw(c-47.114,4.727) -48.9,2.316 ; -48.9,2.924 cw(c-46.4,4.583) -49.4,4.583 -49.4,5.515 ccw(c-52.4,5.515) -49.705,6.833 ccw(c-52.502,5.454) -50.4,7.757 -50.4,13.702 cw(c-49.9,13.702) -49.689,14.155 -48.964,13.817 -49.112,13.499 -48.387,13.161 -48.534,12.844 -47.809,12.506 -47.957,12.189 -47.232,11.851 -47.232,11.55 -42.5,11.55 cw(c-42.5,10.65) -42.5,9.75 -44.7,9.75 -44.7,8.35 ; -48.25,-6.29 -48.9,-6.29 -48.9,7.85 cw(c-48.4,7.85) -48.4,8.35 -44.7,8.35 ; -48.05,-1.74 -47.943,1.74 ; -42.75,-6.29 -41.5,-6.29 -41.5,-2.25 -40.725,-2.25 ; -40.725,4.25 -42.1,4.25 -42.146,9.55 -44.7,9.55 -44.7,8.35 ; 35.925,-2.25 36.7,-2.25 36.7,-6.29 37.95,-6.29 ; 35.925,4.25 37.3,4.25 37.346,9.55 39.9,9.55 ; 39.9,8.75 45.6,8.75 ; 43.143,1.74 43.25,-1.74 ; 43.45,-6.29 44.1,-6.29 44.1,7.85 ccw(c43.6,7.85) 43.6,8.35 39.9,8.35 39.9,9.75 37.7,9.75 cw(c37.7,10.65) 37.7,11.55 42.432,11.55 42.432,11.851 43.157,12.189 43.009,12.506 43.734,12.844 43.587,13.161 44.312,13.499 44.164,13.817 44.889,14.155 cw(c45.1,13.702) 45.6,13.702 45.6,7.757 ccw(c47.702,5.454) 44.905,6.833 ccw(c47.6,5.515) 44.6,5.515 44.6,4.583 cw(c41.6,4.583) 44.1,2.924 ; 44.1,2.316 ccw(c42.314,4.727) 44.83,3.093 45.337,3.874 cw(c47.853,2.241) 46.311,4.814 cw(c47.906,2.134) 47.397,5.211 50.635,10.196 ccw(c50.216,10.468) 50.285,10.963 49.493,11.075 49.444,10.728 48.652,10.839 48.603,10.493 47.811,10.604 47.762,10.258 46.97,10.369 46.806,10.117 45.6,10.9 ; 45.479,7.64 47.938,6.043
  text "123" at -41.3,2.8 h1
  text "244" at 34.2,2.8 h1
  text "122" at 34.3,-1.8 h1
  text "1" at -40.4,-1.8 h1
Mechanical 4:
  circle w0.1: c-41.4,6.65 r0.9
  circle w0.1: c36.6,6.65 r0.9
  lines w0.1: -43.4,0.65 -43.4,9.65 -42.4,9.65 ccw(c-42.4,10.65) -42.4,11.65 -43.4,11.65 -43.4,18.65 ccw(c-43.4,20.65) -43.4,22.65 -43.4,30.65 38.6,30.65 38.6,22.65 ccw(c38.6,20.65) 38.6,18.65 38.6,11.65 37.6,11.65 ccw(c37.6,10.65) 37.6,9.65 38.6,9.65 38.6,0.65 0,0.65 0,3.95 ccw(c-0.5,3.95) -1,3.95 -1,0.65 -43.4,0.65
Mechanical 8:
  drawing of 1515 lines, arcs and shapes, not listed
Mechanical 14:
  drawing of 226 lines, arcs and shapes, not listed
  text "1" at -40.4,-1.8 h1
Mechanical 15:
  lines w0.05: -56.053,10.689 -50.259,14.452 -41.35,14.452 -41.35,6.6 -1.55,6.6 -1.55,7.34 1.55,7.34 1.55,6.6 36.55,6.6 36.55,14.452 45.459,14.452 51.253,10.689 45.85,2.369 45.85,-7.34 36.45,-7.34 36.45,-4.6 1.75,-4.6 1.75,-7.34 -1.75,-7.34 -1.75,-4.6 -41.25,-4.6 -41.25,-7.34 -50.65,-7.34 -50.65,2.369 -56.053,10.689
3D body "MOLEX_87918-0001.stp": height 9.75, standoff -2.53, extent -55.514,-6.63 50.714,12.838

## PRECI-DIP_310-87-104-41-001101 [mm] "4 Contact 2.54mm Pitch Single Row Socket Connector - Mating Pin  Ø0.47mm"
height 4.2
pads (4):
  round 1.5 hole 0.8: 1(0,0) 2(2.54,0) 3(5.08,0) 4(7.62,0)
Top Overlay:
  circle w0.3: c-0.508,1.778 r0.15
  lines w0.2: 1.27,-0.77 1.27,0.77 ; 1.27,-0.77 0.77,-1.27 -0.77,-1.27 -1.27,-0.77 -1.27,0.77 -0.77,1.27 0.77,1.27 1.27,0.77 ; 1.27,-0.77 1.77,-1.27 3.31,-1.27 3.81,-0.77 ; 1.27,0.77 1.77,1.27 3.31,1.27 3.81,0.77 ; 3.81,-0.77 3.81,0.77 ; 3.81,-0.77 4.31,-1.27 5.85,-1.27 6.35,-0.77 ; 3.81,0.77 4.31,1.27 5.85,1.27 6.35,0.77 ; 6.35,-0.77 6.35,0.77 ; 6.35,-0.77 6.85,-1.27 8.39,-1.27 8.89,-0.77 8.89,0.77 8.39,1.27 6.85,1.27 6.35,0.77
Mechanical 8:
  lines w0.1: -0.5,0 0,0 ; 0,-0.5 0,0 ; 0,0.5 0,0 ; 0.5,0 0,0 ; 2.04,0 2.54,0 ; 2.54,-0.5 2.54,0 ; 2.54,0.5 2.54,0 ; 3.04,0 2.54,0 ; 4.58,0 5.08,0 ; 5.08,-0.5 5.08,0 ; 5.08,0.5 5.08,0 ; 5.58,0 5.08,0 ; 7.12,0 7.62,0 ; 7.62,-0.5 7.62,0 ; 7.62,0.5 7.62,0 ; 8.12,0 7.62,0
Mechanical 14:
  circle w0.1: c0,0 r0.9
  circle w0.1: c0,0 r0.7
  circle w0.1: c0,0 r0.4
  circle w0.1: c0,0 r0.25
  circle w0.1: c2.54,0 r0.9
  circle w0.1: c2.54,0 r0.7
  circle w0.1: c2.54,0 r0.4
  circle w0.1: c2.54,0 r0.25
  circle w0.1: c5.08,0 r0.9
  circle w0.1: c5.08,0 r0.7
  circle w0.1: c5.08,0 r0.4
  circle w0.1: c5.08,0 r0.25
  circle w0.1: c7.62,0 r0.9
  circle w0.1: c7.62,0 r0.7
  circle w0.1: c7.62,0 r0.4
  circle w0.1: c7.62,0 r0.25
  circle w0.3: c-0.508,1.778 r0.15
  lines w0.1: 1.27,-0.77 1.27,0.77 ; 1.27,-0.77 0.77,-1.27 -0.77,-1.27 -1.27,-0.77 -1.27,0.77 -0.77,1.27 0.77,1.27 1.27,0.77 ; 1.27,-0.77 1.77,-1.27 3.31,-1.27 3.81,-0.77 ; 1.27,0.77 1.77,1.27 3.31,1.27 3.81,0.77 ; 3.81,-0.77 3.81,0.77 ; 3.81,-0.77 4.31,-1.27 5.85,-1.27 6.35,-0.77 ; 3.81,0.77 4.31,1.27 5.85,1.27 6.35,0.77 ; 6.35,-0.77 6.35,0.77 ; 6.35,-0.77 6.85,-1.27 8.39,-1.27 8.89,-0.77 8.89,0.77 8.39,1.27 6.85,1.27 6.35,0.77
3D body "PRECI-DIP_310-87-104-41-205101.stp": height 4.2, standoff -3.17, extent -1.27,-1.27 8.89,1.27